# Altium footprint library B-NT_CONNECT.PcbLib: 109 footprints (part 3 of 7)
Each footprint in its own frame and in the unit in brackets; x right, y up, seen from the top. Pads: shape width x height; smd on the part's side, far side on the other; paste and mask are expansions set on the pad; w line width, h text height; cw(c..) or ccw(c..) is an arc to the next point about the centre after c.
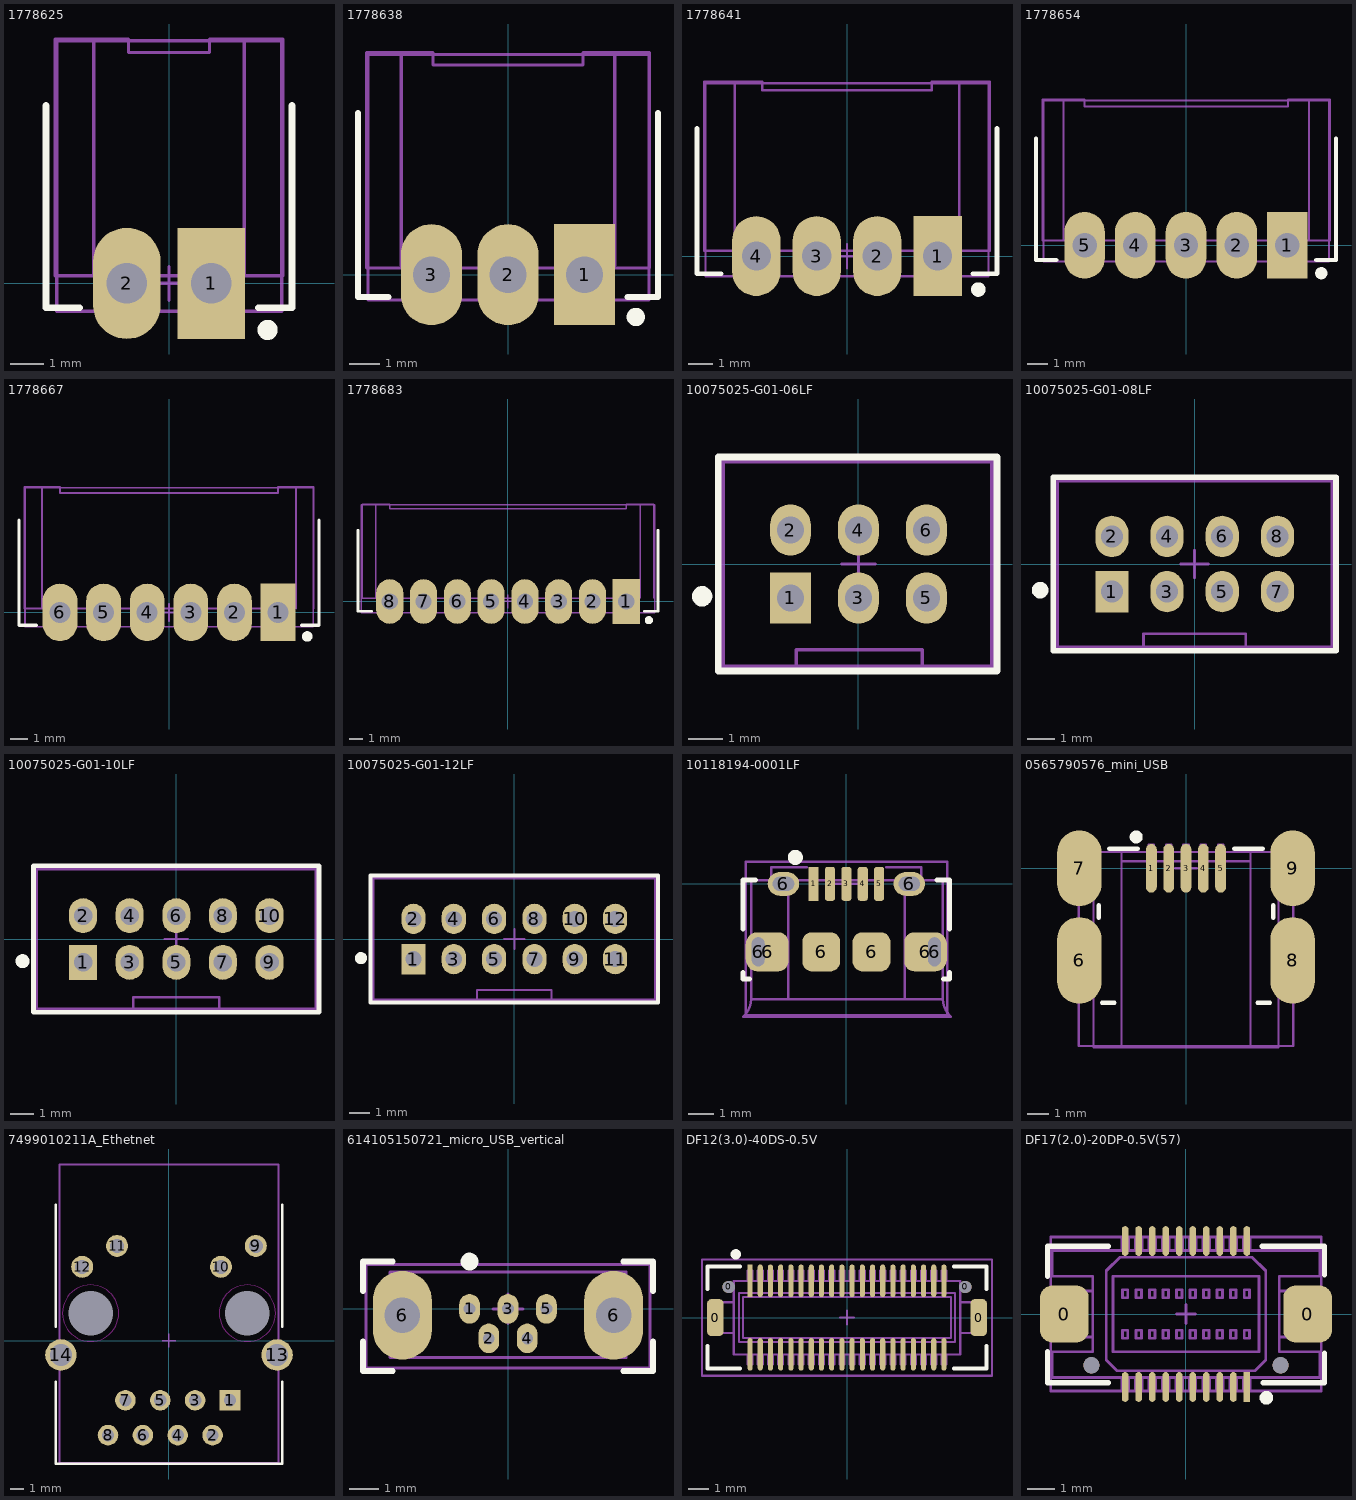
[diagram p2: the footprints below, top view; thin cyan lines are the x and y axes]

## 1778625 [mm]
height 5
pads (2):
  rect 2x3.3 hole 1.2: 1(1.25,0)
  oval 2x3.3 hole 1.2: 2(-1.25,0)
Top Overlay:
  circle w0.3: c2.925,-1.38 r0.15
  lines w0.2: -3.65,5.275 -3.65,-0.725 -2.65,-0.725 ; 2.65,-0.725 3.65,-0.725 3.65,5.275
M3 Top Assy:
  lines w0.1: -2.237,0.3 -2.237,7.225 ; -1.488,0.225 -1.488,-0.375 -0.938,-0.375 -0.938,0.225 ; 0.975,0.225 0.975,-0.375 1.525,-0.375 1.525,0.225 ; 0.987,0.225 0.987,-0.375 1.537,-0.375 1.537,0.225 ; 2.237,0.3 2.237,7.225 ; -3.375,0.225 -3.375,7.25 -1.2,7.25 -1.2,6.85 1.2,6.85 1.2,7.25 3.375,7.25 3.375,0.225 -3.375,0.225
M8 Top Brd Anno:
  lines w0.1: -0.5,0 0.5,0 ; 0,-0.5 0,0.5 ; -3.325,-0.825 3.35,-0.825 3.35,7.2 -3.325,7.2 -3.325,-0.825
3D body "1778625.STEP": height 5, standoff -2.1, extent -3.35,-0.6 3.35,7.2

## 1778638 [mm]
height 5
pads (3):
  rect 2x3.3 hole 1.2: 1(2.5,0)
  oval 2x3.3 hole 1.2: 2(0,0) 3(-2.5,0)
Top Overlay:
  circle w0.3: c4.175,-1.38 r0.15
  lines w0.2: -4.9,5.275 -4.9,-0.725 -3.9,-0.725 ; 3.9,-0.725 4.9,-0.725 4.9,5.275
M3 Top Assy:
  lines w0.1: -3.487,0.3 -3.487,7.225 ; -2.738,0.225 -2.738,-0.375 -2.188,-0.375 -2.188,0.225 ; -0.275,0.225 -0.275,-0.375 0.275,-0.375 0.275,0.225 ; 2.237,0.225 2.237,-0.375 2.787,-0.375 2.787,0.225 ; 2.425,6.85 -2.45,6.85 -2.45,7.25 -4.625,7.25 -4.625,0.225 4.625,0.225 4.625,7.25 2.45,7.25 2.45,6.85 ; 3.487,0.3 3.487,7.225
M8 Top Brd Anno:
  lines w0.1: -0.5,0 0.5,0 ; 0,-0.5 0,0.5 ; -4.575,-0.825 4.6,-0.825 4.6,7.2 -4.575,7.2 -4.575,-0.825
3D body "1778638.STEP": height 5, standoff -2.1, extent -4.6,-0.525 4.6,7.275

## 1778641 [mm]
height 5
pads (4):
  rect 2x3.3 hole 1.2: 1(3.75,0)
  oval 2x3.3 hole 1.2: 2(1.25,0) 3(-1.25,0) 4(-3.75,0)
Top Overlay:
  circle w0.3: c5.425,-1.38 r0.15
  lines w0.2: -6.2,5.275 -6.2,-0.725 -5.2,-0.725 ; 5.2,-0.725 6.2,-0.725 6.2,5.275
M3 Top Assy:
  lines w0.1: -4.637,0.175 -4.637,7.15 ; -3.987,0.225 -3.987,-0.375 -3.437,-0.375 -3.437,0.225 ; -1.525,0.225 -1.525,-0.375 -0.975,-0.375 -0.975,0.225 ; 0.988,0.225 0.988,-0.375 1.538,-0.375 1.538,0.225 ; 3.437,0.225 3.437,-0.375 3.987,-0.375 3.987,0.225 ; 4.637,0.175 4.637,7.15 ; -5.9,0.225 -5.9,7.2 -3.5,7.2 -3.5,6.85 3.5,6.85 3.5,7.2 5.9,7.2 5.9,0.225 -5.9,0.225
M8 Top Brd Anno:
  lines w0.1: -0.5,0 0.5,0 ; 0,-0.5 0,0.5 ; -5.85,-0.825 5.85,-0.825 5.85,7.15 -5.85,7.15 -5.85,-0.825
3D body "1778641.STEP": height 5, standoff -2.1, extent -5.85,-0.55 5.85,7.25

## 1778654 [mm]
height 5
pads (5):
  rect 2x3.3 hole 1.2: 1(5,0)
  oval 2x3.3 hole 1.2: 2(2.5,0) 3(0,0) 4(-2.5,0) 5(-5,0)
Top Overlay:
  circle w0.3: c6.675,-1.38 r0.15
  lines w0.2: -7.4,5.275 -7.4,-0.725 -6.4,-0.725 ; 6.425,-0.725 7.4,-0.725 7.4,5.275
M3 Top Assy:
  lines w0.1: -6.037,0.225 -6.037,7.2 ; -5.262,0.225 -5.262,-0.375 -4.713,-0.375 -4.713,0.225 ; -2.738,0.225 -2.738,-0.375 -2.188,-0.375 -2.188,0.225 ; -0.275,0.225 -0.275,-0.375 0.275,-0.375 0.275,0.225 ; 2.237,0.225 2.237,-0.375 2.787,-0.375 2.787,0.225 ; 4.737,0.225 4.737,-0.375 5.287,-0.375 5.287,0.225 ; 6.063,0.225 6.063,7.2 ; -7.075,0.225 7.1,0.225 7.1,7.2 5.025,7.2 5.025,6.85 -5,6.85 -5,7.2 -7.075,7.2 -7.075,0.225
M8 Top Brd Anno:
  lines w0.1: -0.5,0 0.5,0 ; 0,-0.5 0,0.5 ; -7.025,-0.8 7.05,-0.8 7.05,0.275 7.05,7.15 -7.025,7.15 -7.025,-0.8
3D body "1778654.stp": height 5, standoff -2.1, extent -7.1,-0.6 7.1,7.2

## 1778667 [mm]
height 5
pads (6):
  rect 2x3.3 hole 1.2: 1(6.25,0)
  oval 2x3.3 hole 1.2: 2(3.75,0) 3(1.25,0) 4(-1.25,0) 5(-3.75,0) 6(-6.25,0)
Top Overlay:
  circle w0.3: c7.925,-1.38 r0.15
  lines w0.2: -8.6,5.275 -8.6,-0.725 -7.6,-0.725 ; 7.6,-0.725 8.6,-0.725 8.6,5.275
M3 Top Assy:
  lines w0.1: -7.288,0.225 -7.288,7.2 ; -6.513,0.225 -6.513,-0.375 -5.963,-0.375 -5.963,0.225 ; -4.013,0.225 -4.013,-0.375 -3.463,-0.375 -3.463,0.225 ; -1.488,0.225 -1.488,-0.375 -0.938,-0.375 -0.938,0.225 ; 0.975,0.225 0.975,-0.375 1.525,-0.375 1.525,0.225 ; 3.487,0.225 3.487,-0.375 4.037,-0.375 4.037,0.225 ; 5.963,0.225 5.963,-0.375 6.513,-0.375 6.513,0.225 ; 7.1,0.225 -8.3,0.225 -8.3,7.2 -6.25,7.2 -6.25,6.85 6.25,6.85 6.25,7.2 8.3,7.2 8.3,0.225 ; 7.288,0.225 7.288,7.2
M8 Top Brd Anno:
  lines w0.1: -0.5,0 0.5,0 ; 0,-0.5 0,0.5 ; -8.25,-0.825 8.275,-0.825 8.275,7.15 -8.25,7.15 -8.25,-0.825
3D body "1778667.STEP": height 5, standoff -2.1, extent -8.325,-0.6 8.375,7.2

## 1778683 [mm]
height 5
pads (8):
  rect 2x3.3 hole 1.2: 1(8.75,0)
  oval 2x3.3 hole 1.2: 2(6.25,0) 3(3.75,0) 4(1.25,0) 5(-1.25,0) 6(-3.75,0) 7(-6.25,0) 8(-8.75,0)
Top Overlay:
  circle w0.3: c10.425,-1.38 r0.15
  lines w0.2: -11.1,5.275 -11.1,-0.725 -10.1,-0.725 ; 10.1,-0.725 11.1,-0.725 11.1,5.275
M3 Top Assy:
  lines w0.1: -9.788,0.225 -9.788,7.2 ; -9.013,0.225 -9.013,-0.375 -8.463,-0.375 -8.463,0.225 ; -6.513,0.225 -6.513,-0.375 -5.963,-0.375 -5.963,0.225 ; -4.013,0.225 -4.013,-0.375 -3.463,-0.375 -3.463,0.225 ; -1.512,0.225 -1.512,-0.375 -0.962,-0.375 -0.962,0.225 ; 1.012,0.225 1.012,-0.375 1.562,-0.375 1.562,0.225 ; 3.475,0.225 3.475,-0.375 4.025,-0.375 4.025,0.225 ; 5.987,0.225 5.987,-0.375 6.537,-0.375 6.537,0.225 ; 8.463,0.225 8.463,-0.375 9.013,-0.375 9.013,0.225 ; 9.6,0.225 -10.8,0.225 -10.8,7.2 -8.75,7.2 -8.75,6.85 8.75,6.85 8.75,7.2 10.8,7.2 10.8,0.225 ; 9.788,0.225 9.788,7.2
M8 Top Brd Anno:
  lines w0.1: -0.5,0 0.5,0 ; 0,-0.5 0,0.5 ; -10.85,-0.825 10.85,-0.825 10.85,7.15 -10.85,7.15 -10.85,-0.825
3D body "1778683.STEP": height 5, standoff -2.1, extent -10.85,-0.6 10.85,7.2

## 10075025-G01-06LF [mm]
height 6
pads (6):
  rect 1.2x1.5 hole 0.8: 1(-2,-1)
  oval 1.2x1.5 hole 0.8: 2(-2,1) 3(0,-1) 4(0,1) 5(2,-1) 6(2,1)
Top Overlay:
  circle w0.3: c-4.6,-0.95 r0.15
  lines w0.2: -4.125,-3.15 4.075,-3.15 4.075,3.15 -4.125,3.15 -4.125,-3.15
M3 Top Assy:
  lines w0.1: -1.825,-3.05 -1.825,-2.525 1.875,-2.525 1.875,-3.05 ; -4.025,-3.05 3.975,-3.05 3.975,3.05 -4.025,3.05 -4.025,-3.05 ; -2.25,-1.255 -1.75,-1.255 -1.75,-0.755 -2.25,-0.755 -2.25,-1.255 ; -2.25,0.745 -1.75,0.745 -1.75,1.245 -2.25,1.245 -2.25,0.745 ; -0.25,-1.255 0.25,-1.255 0.25,-0.755 -0.25,-0.755 -0.25,-1.255 ; -0.25,0.745 0.25,0.745 0.25,1.245 -0.25,1.245 -0.25,0.745 ; 1.75,-1.255 2.25,-1.255 2.25,-0.755 1.75,-0.755 1.75,-1.255 ; 1.75,0.745 2.25,0.745 2.25,1.245 1.75,1.245 1.75,0.745
  text "1" at -3.35,-2.325 h1
  text "2" at -3.5,1.3 h1
M8 Top Brd Anno:
  lines w0.1: -0.5,0 0.5,0 ; 0,-0.5 0,0.5 ; -3.975,-3 -3.975,3 3.925,3 3.925,-3 -3.975,-3
3D body "10075025-G01-06ULF.STEP": height 5.85, standoff -2, extent -4.025,-3.05 4.075,3.05

## 10075025-G01-08LF [mm]
height 6
pads (8):
  rect 1.2x1.5 hole 0.8: 1(-3,-1)
  oval 1.2x1.5 hole 0.8: 2(-3,1) 3(-1,-1) 4(-1,1) 5(1,-1) 6(1,1) 7(3,-1) 8(3,1)
Top Overlay:
  circle w0.3: c-5.6,-0.95 r0.15
  lines w0.2: 5.125,-3.15 5.125,3.15 ; 5.125,-3.15 5.125,-3.15 ; 5.125,-3.15 -5.125,-3.15 -5.125,3.15 5.125,3.15 ; 5.125,3.15 5.125,3.15
M3 Top Assy:
  lines w0.1: -1.85,-3.05 -1.85,-2.525 1.85,-2.525 1.85,-3.05 ; -5.025,-3.05 -5.025,3.05 5.025,3.05 5.025,-3.05 -5.025,-3.05 ; -3.25,-1.255 -3.25,-0.755 -2.75,-0.755 -2.75,-1.255 -3.25,-1.255 ; -3.25,0.745 -3.25,1.245 -2.75,1.245 -2.75,0.745 -3.25,0.745 ; -1.25,-1.255 -1.25,-0.755 -0.75,-0.755 -0.75,-1.255 -1.25,-1.255 ; -1.25,0.745 -1.25,1.245 -0.75,1.245 -0.75,0.745 -1.25,0.745 ; 0.75,-1.255 0.75,-0.755 1.25,-0.755 1.25,-1.255 0.75,-1.255 ; 0.75,0.745 0.75,1.245 1.25,1.245 1.25,0.745 0.75,0.745 ; 2.75,-1.255 3.25,-1.255 3.25,-0.755 2.75,-0.755 2.75,-1.255 ; 2.75,0.745 3.25,0.745 3.25,1.245 2.75,1.245 2.75,0.745
  text "2" at -4.5,1.3 h1
  text "1" at -4.35,-2.325 h1
M8 Top Brd Anno:
  lines w0.1: -0.5,0 0.5,0 ; 0,-0.5 0,0.5 ; -4.975,-3 4.975,-3 4.975,3 -4.975,3 -4.975,-3
3D body "10075025-G01-08ULF.STEP": height 5.85, standoff -2, extent -5,-3.05 5,3.05

## 10075025-G01-10LF [mm]
height 6
pads (10):
  rect 1.2x1.5 hole 0.8: 1(-4,-1)
  oval 1.2x1.5 hole 0.8: 2(-4,1) 3(-2,-1) 4(-2,1) 5(0,-1) 6(0,1) 7(2,-1) 8(2,1) 9(4,-1) 10(4,1)
Top Overlay:
  circle w0.3: c-6.6,-0.95 r0.15
  lines w0.2: -6.125,-3.15 6.125,-3.15 6.125,3.15 -6.125,3.15 -6.125,-3.15
M3 Top Assy:
  lines w0.1: -1.85,-3.025 -1.85,-2.5 1.85,-2.5 1.85,-3.025 ; -6.025,-3.05 -6.025,3.05 6.025,3.05 6.025,-3.05 -6.025,-3.05 ; -4.25,-1.255 -4.25,-0.755 -3.75,-0.755 -3.75,-1.255 -4.25,-1.255 ; -4.25,0.745 -4.25,1.245 -3.75,1.245 -3.75,0.745 -4.25,0.745 ; -2.25,-1.255 -2.25,-0.755 -1.75,-0.755 -1.75,-1.255 -2.25,-1.255 ; -2.25,0.745 -2.25,1.245 -1.75,1.245 -1.75,0.745 -2.25,0.745 ; -0.25,-1.255 -0.25,-0.755 0.25,-0.755 0.25,-1.255 -0.25,-1.255 ; -0.25,0.745 -0.25,1.245 0.25,1.245 0.25,0.745 -0.25,0.745 ; 1.75,-1.255 2.25,-1.255 2.25,-0.755 1.75,-0.755 1.75,-1.255 ; 1.75,0.745 2.25,0.745 2.25,1.245 1.75,1.245 1.75,0.745 ; 3.75,-1.255 3.75,-0.755 4.25,-0.755 4.25,-1.255 3.75,-1.255 ; 3.75,0.745 3.75,1.245 4.25,1.245 4.25,0.745 3.75,0.745
  text "2" at -5.5,1.3 h1
  text "1" at -5.35,-2.325 h1
M8 Top Brd Anno:
  lines w0.1: -0.5,0 0.5,0 ; 0,-0.5 0,0.5 ; -5.975,-3 5.975,-3 5.975,3 -5.975,3 -5.975,-3
3D body "10075025-G01-10ULF.STEP": height 5.85, standoff -2, extent -6,-3.025 6,3.075

## 10075025-G01-12LF [mm]
height 6
pads (12):
  rect 1.2x1.5 hole 0.8: 1(-5,-1)
  oval 1.2x1.5 hole 0.8: 2(-5,1) 3(-3,-1) 4(-3,1) 5(-1,-1) 6(-1,1) 7(1,-1) 8(1,1) 9(3,-1) 10(3,1) 11(5,-1) 12(5,1)
Top Overlay:
  circle w0.3: c-7.6,-0.95 r0.15
  lines w0.2: -5.125,-3.15 7.125,-3.15 7.125,3.15 -5.125,3.15 ; 5.125,-3.15 -7.125,-3.15 -7.125,3.15 5.125,3.15
M3 Top Assy:
  lines w0.1: -5.025,-3.05 7.025,-3.05 7.025,3.05 -5.025,3.05 ; -1.85,-3.05 -1.85,-2.525 1.85,-2.525 1.85,-3.05 ; 5.025,-3.05 -7.025,-3.05 -7.025,3.05 5.025,3.05 ; -5.25,-1.255 -4.75,-1.255 -4.75,-0.755 -5.25,-0.755 -5.25,-1.255 ; -5.25,0.745 -4.75,0.745 -4.75,1.245 -5.25,1.245 -5.25,0.745 ; -3.25,-1.255 -2.75,-1.255 -2.75,-0.755 -3.25,-0.755 -3.25,-1.255 ; -3.25,0.745 -2.75,0.745 -2.75,1.245 -3.25,1.245 -3.25,0.745 ; -1.25,-1.255 -0.75,-1.255 -0.75,-0.755 -1.25,-0.755 -1.25,-1.255 ; -1.25,0.745 -0.75,0.745 -0.75,1.245 -1.25,1.245 -1.25,0.745 ; 0.75,-1.255 0.75,-0.755 1.25,-0.755 1.25,-1.255 0.75,-1.255 ; 0.75,0.745 0.75,1.245 1.25,1.245 1.25,0.745 0.75,0.745 ; 2.75,-1.255 3.25,-1.255 3.25,-0.755 2.75,-0.755 2.75,-1.255 ; 2.75,0.745 3.25,0.745 3.25,1.245 2.75,1.245 2.75,0.745 ; 4.75,-1.255 4.75,-0.755 5.25,-0.755 5.25,-1.255 4.75,-1.255 ; 4.75,0.745 4.75,1.245 5.25,1.245 5.25,0.745 4.75,0.745
  text "1" at -6.35,-2.325 h1
  text "2" at -6.5,1.3 h1
M8 Top Brd Anno:
  lines w0.1: -0.5,0 0.5,0 ; 0,-0.5 0,0.5 ; -6.975,-3 -6.975,3 6.975,3 6.975,-3 -6.975,-3
3D body "10075025-G01-12ULF.STEP": height 5.85, standoff -2, extent -7,-3.05 7,3.05

## 10118194-0001LF [mm] "microUSB"
pads (13):
  rect 0.4x1.35 smd: 1(-1.3,0)
  rrect50% 0.4x1.35 smd: 2(-0.65,0) 3(0,0) 4(0.65,0) 5(1.3,0)
  oval 1x1.55 hole 0.5 slot 1.15 at 90 deg: 6(-3.5,-2.7) 6(3.5,-2.7)
  rrect50% 1.65x1.55 smd: 6(-3.125,-2.7) 6(3.125,-2.7)
  oval 1.25x0.95 hole 0.55 slot 0.85 at 0 deg: 6(-2.5,0) 6(2.5,0)
  rrect50% 1.5x1.55 smd: 6(-1,-2.7) 6(1,-2.7)
Top Overlay:
  circle w0.3: c-2.025,1.05 r0.15
  lines w0.2: -4.1,-3.525 -4.1,-3.775 -3.85,-3.775 ; -4.1,-1.8 -4.1,0.15 ; -3.6,0.15 -4.1,0.15 ; 3.6,0.15 4.1,0.15 4.1,-1.8 ; 3.85,-3.775 4.1,-3.775 4.1,-3.525 ; -4.1,0.15 -4.1,0.15
M3 Top Assy:
  lines w0.1: -3.771,-4.575 cw(c-4.85,-4.5) -4.1,-5.28 4.1,-5.28 ; -2.975,0.15 -2.975,0.65 -1.575,0.65 ; -2.3,-4.575 -2.3,0.15 ; -1.425,0.175 -1.425,0.525 -1.175,0.525 -1.175,0.175 ; -0.775,0.175 -0.775,0.525 -0.525,0.525 -0.525,0.175 ; -0.125,0.175 -0.125,0.525 0.125,0.525 0.125,0.175 ; 0.525,0.175 0.525,0.525 0.775,0.525 0.775,0.175 ; 1.175,0.175 1.175,0.525 1.425,0.525 1.425,0.175 ; 1.575,0.65 2.975,0.65 2.975,0.15 ; 2.325,-4.575 2.325,0.15 ; 3.821,-4.575 ccw(c4.9,-4.5) 4.15,-5.28 ; -3.775,-4.575 -3.775,-4.575 ; -3.775,-4.575 -3.775,0.15 3.825,0.15 3.825,-4.575 -3.775,-4.575
M8 Top Brd Anno:
  lines w0.1: -0.5,0 0.5,0 ; 0,-0.5 0,0.5 ; -4,-5.225 -4,0.05 -4,0.875 4,0.875 4,0.05 4,-5.225 -4,-5.225
3D body "User_Library-MicroUSB-B_Molex_105017-0001.STEP": height 2.68, standoff -0.63, extent -4.1,-5.28 4.1,0.15

## 0565790576_mini_USB [mm]
pads (9):
  oval 0.5x2.25 smd: 1(-1.6,0) 2(-0.8,0) 3(0,0) 4(0.8,0) 5(1.6,0)
  oval 2.05x4 smd: 6(-4.925,-4.25) 8(4.925,-4.25)
  oval 2.05x3.5 smd: 7(-4.925,0) 9(4.925,0)
Top Overlay:
  circle w0.3: c-2.3,1.45 r0.15
  lines w0.2: -4.025,-2.275 -4.025,-1.7 ; -3.875,-6.2 -3.3,-6.2 ; -3.55,0.9 -2.225,0.9 ; 2.225,0.9 3.55,0.9 ; 3.3,-6.2 3.875,-6.2 ; 4.025,-2.275 4.025,-1.7
M3 Top Assy:
  lines w0.1: -4.275,-5.075 -5.225,-5.075 -5.225,-3.5 -4.275,-3.5 ; -4.275,-0.825 -5.225,-0.825 -5.225,0.75 -4.275,0.75 ; -2.975,-8.275 -2.975,0.75 -4.275,0.75 ; -2.975,0.325 2.975,0.325 ; -1.725,0.325 -1.725,1.1 -1.475,1.1 -1.475,0.325 ; -0.925,0.325 -0.925,1.1 -0.675,1.1 -0.675,0.325 ; -0.125,0.325 -0.125,1.1 0.125,1.1 0.125,0.325 ; 0.675,0.325 0.675,1.1 0.925,1.1 0.925,0.325 ; 1.475,0.325 1.475,1.1 1.725,1.1 1.725,0.325 ; 2.975,-8.275 2.975,0.75 4.275,0.75 ; 4.275,-5.075 5.225,-5.075 5.225,-3.5 4.275,-3.5 ; 4.275,-0.825 5.225,-0.825 5.225,0.75 4.275,0.75 ; -4.275,0.75 -4.275,-8.275 4.275,-8.275 4.275,0.75
M8 Top Brd Anno:
  lines w0.1: -0.5,0 0.5,0 ; 0,-0.5 0,0.5 ; -4.95,-8.2 -4.95,0.75 -4.925,0.75 4.95,0.75 4.95,-8.2 -4.95,-8.2
3D body "Open CASCADE STEP translator 6.8 1.4.1.1.STEP": height 3.95, standoff 0, extent -4.95,-8.2 4.95,0.8

## 7499010211A_Ethetnet [mm]
pads (16):
  rect 1.5x1.5 hole 0.9: 1(4.445,-4.356)
  round 1.5 hole 0.9: 2(3.175,-6.896) 3(1.905,-4.356) 4(0.635,-6.896) 5(-0.635,-4.356) 6(-1.905,-6.896) 7(-3.175,-4.356) 8(-4.445,-6.896)
  round 1.6 hole 1.02: 9(6.325,6.896) 10(3.785,5.372) 11(-3.785,6.896) 12(-6.325,5.372)
  round 2.3 hole 1.6: 13(7.874,-1.054) 14(-7.874,-1.054)
  round 1.016 / inner round 3.81 / far side round 1.016 hole 3.251: ""(-5.715,1.994) ""(5.715,1.994)
Top Overlay:
  lines w0.2: -8.25,-3 -8.25,-8.979 8.25,-8.979 8.25,-3 ; -8.25,1 -8.25,9.9 ; 8.25,1 8.25,9.9
M3 Top Assy:
  lines w0.1: -8,-9 8,-9 8,12.865 7.885,12.865 -8,12.865 -8,-9
M8 Top Brd Anno:
  lines w0.1: -0.5,0 0.5,0 ; 0,-0.5 0,0.5 ; -7.95,-8.9 -7.95,12.825 7.95,12.825 7.95,-8.9 -7.95,-8.9
Multi-Layer keep-out:
  circle w0.025: c5.715,1.994 r2.057
  circle w0.025: c-5.715,1.994 r2.057
3D body "STEP-7499010211A-rev1.stp": height 13.75, standoff -2.8, extent -7.94,-8.95 7.94,12.89

## 614105150721_micro_USB_vertical [mm]
pads (7):
  oval 0.7x1 hole 0.4: 1(-1.3,0) 2(-0.65,-1) 3(0,0) 4(0.65,-1) 5(1.3,0)
  oval 2x3 hole 1.2: 6(-3.575,-0.22) 6(3.575,-0.22)
Top Overlay:
  circle w0.3: c-1.3,1.6 r0.15
  lines w0.2: -4.9,-1.1 -4.9,-2.1 -3.9,-2.1 ; -4.9,0.6 -4.9,1.6 -3.9,1.6 ; 3.9,-2.1 4.9,-2.1 4.9,-1.1 ; 3.9,1.6 4.9,1.6 4.9,0.6
M3 Top Assy:
  lines w0.1: -4,-1.65 -4,1.25 4,1.25 4,-1.65 -4,-1.65
M8 Top Brd Anno:
  lines w0.1: -0.5,0 0.5,0 ; 0,-0.5 0,0.5 ; -4.8,-2 4.8,-2 4.8,1.5 -4.8,1.5 -4.8,-2
3D body "614105150721 (rev1).stp": height 5.56, standoff -1.89, extent -4,-1.65 4,1.25

## DF12(3.0)-40DS-0.5V [mm] "CONN RECEPT 40POS 3MM SMD 0.5MM"
height 2.2
pads (44):
  rrect50% 0.8x1.8 smd: 0(-6.45,0) 0(6.45,0)
  round 0.6 hole 0.6: 0(-5.8,1.5) 0(5.8,1.5)
  rect 0.25x1.6 smd: 1(-4.75,1.8)
  oval 0.25x1.6 smd: 2(-4.75,-1.8) 3(-4.25,1.8) 4(-4.25,-1.8) 5(-3.75,1.8) 6(-3.75,-1.8) 7(-3.25,1.8) 8(-3.25,-1.8) 9(-2.75,1.8) 10(-2.75,-1.8) 11(-2.25,1.8) 12(-2.25,-1.8) 13(-1.75,1.8) 14(-1.75,-1.8) 15(-1.25,1.8) 16(-1.25,-1.8) 17(-0.75,1.8) 18(-0.75,-1.8) 19(-0.25,1.8) 20(-0.25,-1.8) 21(0.25,1.8) 22(0.25,-1.8) 23(0.75,1.8) 24(0.75,-1.8) 25(1.25,1.8) 26(1.25,-1.8) 27(1.75,1.8) 28(1.75,-1.8) 29(2.25,1.8) 30(2.25,-1.8) 31(2.75,1.8) 32(2.75,-1.8) 33(3.25,1.8) 34(3.25,-1.8) 35(3.75,1.8) 36(3.75,-1.8) 37(4.25,1.8) 38(4.25,-1.8) 39(4.75,1.8) 40(4.75,-1.8)
Top Overlay:
  circle w0.3: c-5.45,3.1 r0.1
  lines w0.2: -6.825,-1.4 -6.825,-2.5 -5.25,-2.5 ; -6.825,1.4 -6.825,2.5 -5.25,2.5 ; 5.25,-2.5 6.825,-2.5 6.825,-1.4 ; 5.25,2.5 6.825,2.5 6.825,1.4
M3 Top Assy:
  drawing of 176 lines, arcs and shapes, not listed
M8 Top Brd Anno:
  lines w0.1: -0.35,0 0.35,0 ; 0,-0.35 0,0.35 ; -7.1,-2.85 -7.1,2.85 7.1,2.85 7.1,-2.85 -7.1,-2.85
3D body "DF12(3.0)-40DS-0.5V.stp": height 2.2, standoff -0.6, extent -6.55,-2.3 6.55,2.3

## DF17(2.0)-20DP-0.5V(57) [mm] "CONN HEADER 20POS .5MM SMD W/FIT"
height 4.3
pads (24):
  rrect50% 1.8x2.1 smd: 0(-4.5,0) 0(4.5,0)
  rect 0.25x1.1 smd: 1(2.25,-2.7)
  oval 0.25x1.1 smd: 2(2.25,2.7) 3(1.75,-2.7) 4(1.75,2.7) 5(1.25,-2.7) 6(1.25,2.7) 7(0.75,-2.7) 8(0.75,2.7) 9(0.25,-2.7) 10(0.25,2.7) 11(-0.25,-2.7) 12(-0.25,2.7) 13(-0.75,-2.7) 14(-0.75,2.7) 15(-1.25,-2.7) 16(-1.25,2.7) 17(-1.75,-2.7) 18(-1.75,2.7) 19(-2.25,-2.7) 20(-2.25,2.7)
  round 0.6 hole 0.6: hole(-3.5,-1.9) hole(3.5,-1.9)
Top Overlay:
  circle w0.3: c2.975,-3.1 r0.1
  lines w0.2: -5.125,-1.4 -5.125,-2.55 -2.875,-2.55 ; -5.125,1.4 -5.125,2.5 -2.875,2.5 ; 2.825,2.5 5.125,2.5 5.125,1.45 ; 2.85,-2.55 5.125,-2.55 5.125,-1.45
M3 Top Assy:
  drawing of 174 lines, arcs and shapes, not listed
M8 Top Brd Anno:
  lines w0.1: -0.35,0 0.35,0 ; 0,-0.35 0,0.35 ; -5,-2.85 5,-2.85 5,2.85 -5,2.85 -5,-2.85
3D body "DF17(2_0)-20DP-0_5V.stp": height 4.24, standoff -0.66, extent -5,-2.85 5,2.85